# Altium footprint library ThanhNT.PcbLib: 579 footprints (part 11 of 37)
Each footprint in its own frame and in the unit in brackets; x right, y up, seen from the top. Pads: shape width x height; smd on the part's side, far side on the other; paste and mask are expansions set on the pad; w line width, h text height; cw(c..) or ccw(c..) is an arc to the next point about the centre after c.
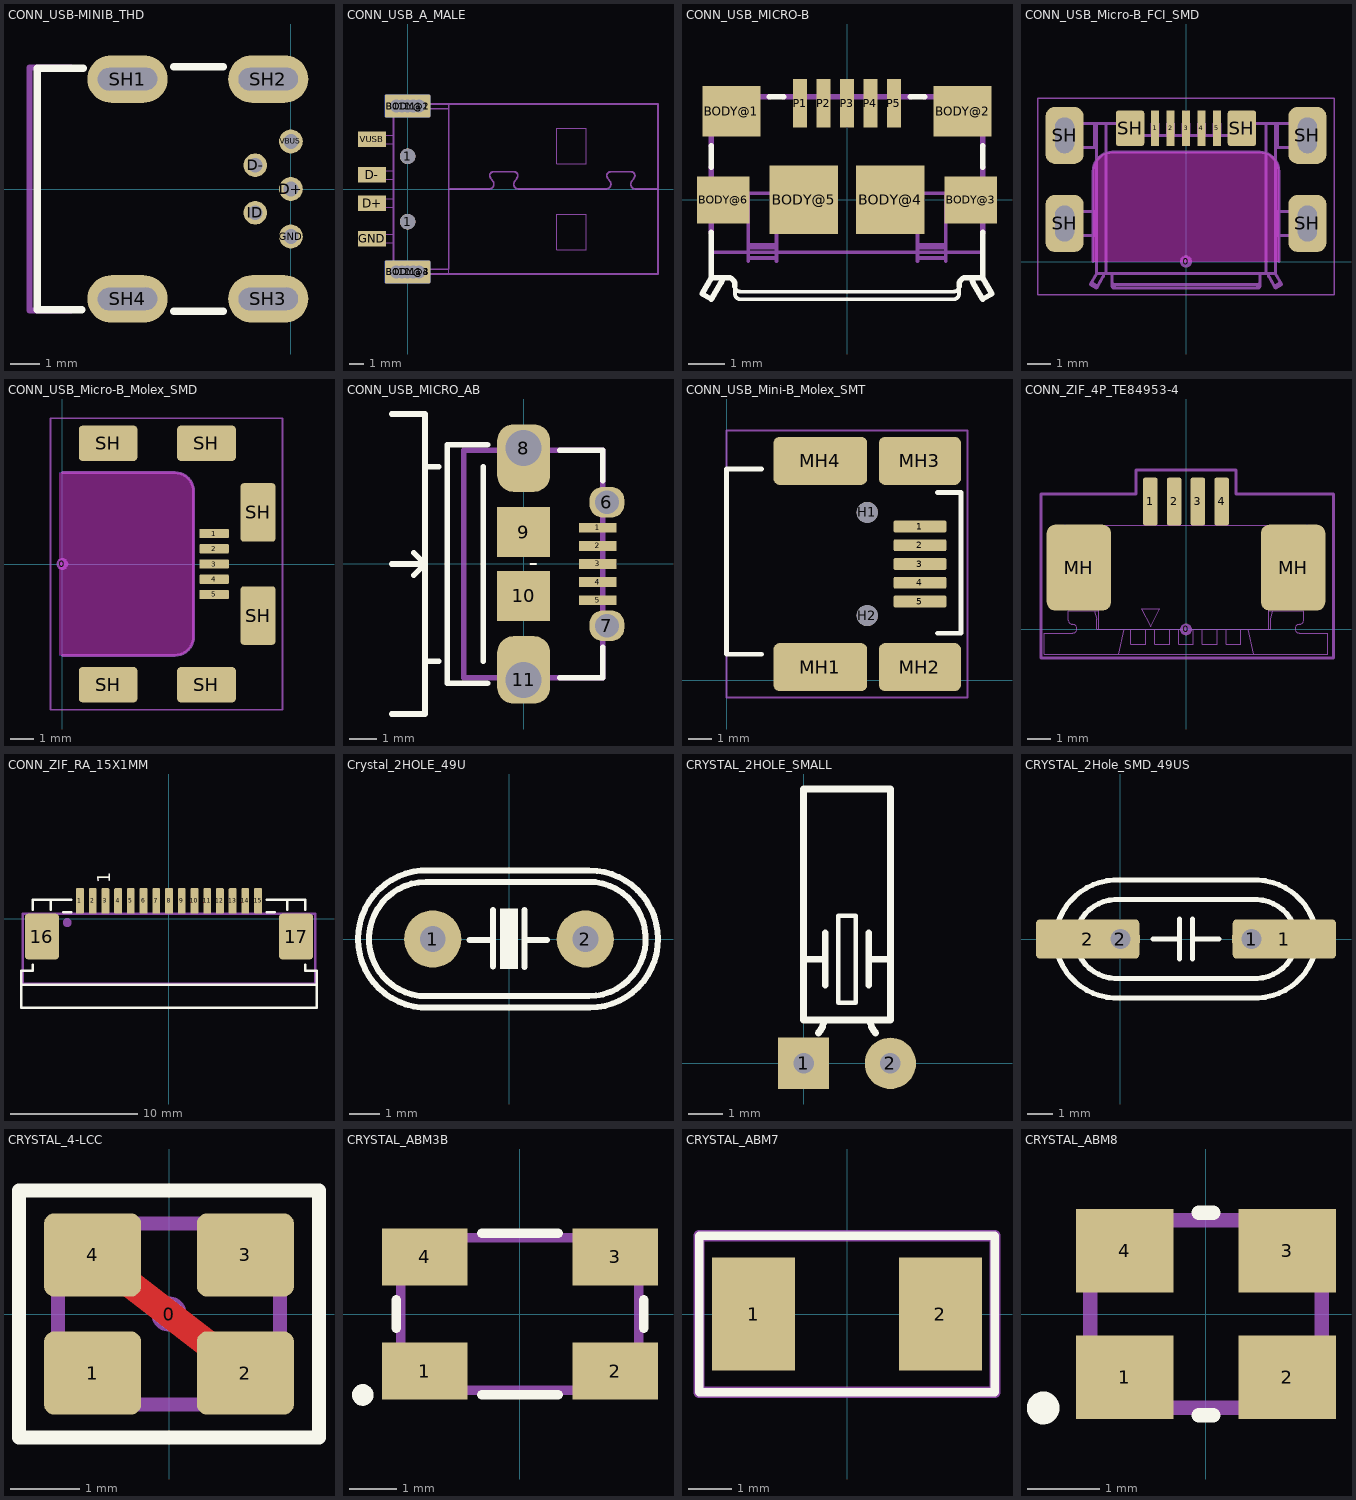
[diagram p10: the footprints below, top view; thin cyan lines are the x and y axes]

## CONN_USB-MINIB_THD [mm]
pads (9):
  round 0.8 hole 0.5: D+(0,0) D-(-1.2,0.8) GND(0,-1.6) ID(-1.2,-0.8) VBUS(0,1.6)
  oval 2.7x1.6 hole 0.762 slot 2 at 0.4 deg: SH1(-5.5,3.7) SH2(-0.762,3.7) SH3(-0.762,-3.7) SH4(-5.5,-3.7)
Top Overlay:
  lines w0.254: -7.036,-4.064 -8.534,-4.064 -8.534,4.064 -6.985,4.064 ; -3.937,-4.115 -2.286,-4.115 ; -3.937,4.115 -2.286,4.115
Mechanical 16:
  lines w0.203: -7.396,-4.089 -8.796,-4.089 -8.796,4.089 -7.396,4.089
3D body "43797.stp": height 3.91, standoff -2.59, extent -8.721,-4.075 0.104,4.075

## CONN_USB_A_MALE [mil]
pads (20):
  round 35.43 hole 35.43: 1(-31.5,-230.32) 1(-31.5,230.32) 1(-15.75,-230.32) 1(-15.75,230.32) 1(0,-230.32) 1(0,230.32) 1(15.75,-230.32) 1(15.75,230.32) 1(31.5,-230.32) 1(31.5,230.32)
  round 43.31 hole 43.31: 1(0,-90.55) 1(0,90.55)
  rrect10% 125.98x62.99 smd: BODY@1(0,230.32) BODY@3(0,-230.32)
  rrect10% 125.98x62.99 smd far side: BODY@2(0,230.32) BODY@4(0,-230.32)
  rect 78.35x43.31 smd: D+(-98.43,-39.37) D-(-98.43,39.37) GND(-98.43,-137.8) VUSB(-98.43,137.8)
Mechanical 1:
  lines w0: -31.5,-248.03 cw(c-31.5,-230.31) -31.5,-212.6 31.5,-212.6 cw(c31.5,-230.31) 31.5,-248.03 -31.5,-248.03 ; -31.5,212.6 cw(c-31.5,230.31) -31.5,248.03 31.5,248.03 cw(c31.5,230.31) 31.5,212.6 -31.5,212.6
Mechanical 11:
  lines w0: -31.5,212.6 cw(c-31.5,230.31) -31.5,248.03 31.5,248.03 cw(c31.5,230.31) 31.5,212.6 -31.5,212.6
Mechanical 16:
  lines w2: -76.77,-149.61 -76.77,-125.98 ; -76.77,-51.18 -76.77,-27.56 ; -76.77,27.56 -76.77,51.18 ; -39.37,-222.44 -39.37,-236.22 -39.37,-253.15 39.37,-253.15 39.37,-236.22 39.37,-222.44 ; -39.37,-149.61 -125.98,-149.61 -125.98,-125.98 -39.37,-125.98 ; -39.37,-51.18 -125.98,-51.18 -125.98,-27.56 -39.37,-27.56 ; -39.37,27.56 -125.98,27.56 -125.98,51.18 -39.37,51.18 ; -39.37,125.98 -76.77,125.98 ; -39.37,149.61 -76.77,149.61 ; -39.37,222.44 -39.37,236.22 -39.37,253.15 39.37,253.15 39.37,236.22 39.37,222.44 ; 114.17,-236.22 114.17,-222.44 ; 296.68,20.72 296.96,21.13 ; 621.48,20.72 621.76,21.13 ; -76.77,125.98 -76.77,149.61 ; -76.77,125.98 -125.98,125.98 -125.98,149.61 -76.77,149.61 ; 414.17,-168.11 414.17,-69.69 495.28,-69.69 495.28,-168.11 414.17,-168.11 ; 414.17,69.69 414.17,168.11 495.28,168.11 495.28,69.69 414.17,69.69
  lines w5: -39.37,-236.22 39.37,-236.22 114.17,-236.22 694.88,-236.22 694.88,0 ; -39.37,236.22 39.37,236.22 114.17,236.22 ; 236.9,21.13 cw(c225.8,13.37) 227.95,0 114.17,0 ; 237.18,20.72 229.83,31.5 cw(c238.19,37.4) 238.19,47.64 295.67,47.64 cw(c295.67,37.4) 304.03,31.5 296.96,21.13 ccw(c308.06,13.37) 305.91,0 552.76,0 ccw(c550.61,13.37) 561.7,21.13 ; 561.98,20.72 554.63,31.5 cw(c562.99,37.4) 562.99,47.64 620.47,47.64 cw(c620.47,37.4) 628.83,31.5 621.76,21.13 ccw(c632.86,13.37) 630.71,0 694.88,0 ; 114.17,0 114.17,-222.44 -39.37,-222.44 -39.37,-149.61 -39.37,-125.98 -39.37,-51.18 -39.37,-27.56 -39.37,27.56 -39.37,51.18 -39.37,125.98 -39.37,149.61 -39.37,222.44 39.37,222.44 114.17,222.44 ; 114.17,0 114.17,222.44 ; 114.17,222.44 114.17,236.22 ; 114.17,236.22 694.88,236.22 694.88,0
Mechanical 30:
  lines w0: -31.5,212.6 cw(c-31.5,230.31) -31.5,248.03 31.5,248.03 cw(c31.5,230.31) 31.5,212.6 -31.5,212.6

## CONN_USB_MICRO-B [mm]
pads (11):
  rect 1.6x1.4 smd: BODY@1(-3.2,2.45) BODY@2(3.2,2.45)
  rect 1.45x1.3 smd: BODY@3(3.425,0) BODY@6(-3.425,0)
  rect 1.9x1.9 smd: BODY@4(1.2,0) BODY@5(-1.2,0)
  rect 0.4x1.35 smd: P1(-1.3,2.675) P2(-0.65,2.675) P3(0,2.675) P4(0.65,2.675) P5(1.3,2.675)
Top Overlay:
  lines w0.102: -3.1,-2.6 ccw(c-2.95,-2.6) -2.95,-2.75 2.95,-2.75 ccw(c2.95,-2.6) 3.1,-2.6 3.1,-2.39 cw(c2.95,-2.39) 2.95,-2.54 -2.95,-2.54 cw(c-2.95,-2.39) -3.1,-2.39 -3.1,-2.6
  lines w0.152: -3.75,-0.9 -3.75,-2.15 ; -3.75,0.9 -3.75,1.5 ; -3.1,-2.39 -3.1,-2.35 ccw(c-3.3,-2.35) -3.3,-2.15 -3.45,-2.15 ; -2.15,2.85 -1.75,2.85 ; 1.75,2.85 2.15,2.85 ; 3.1,-2.39 3.1,-2.35 cw(c3.3,-2.35) 3.3,-2.15 3.45,-2.15 ; 3.75,-0.9 3.75,-2.15 ; 3.75,0.9 3.75,1.5 ; -3.75,-2.15 -3.45,-2.15 ; -3.75,-2.15 -4.01,-2.6 -3.75,-2.75 -3.484,-2.288 ccw(c-3.725,-2.157) -3.45,-2.15 ; 3.45,-2.15 ccw(c3.75,-2.15) 3.49,-2.3 3.75,-2.75 4.01,-2.6 3.75,-2.15 ; 3.45,-2.15 3.75,-2.15
Mechanical 14:
  lines w0.102: -3.75,-1.45 3.75,-1.45 ; -2.73,-1.69 -2.73,-1.61 ; -1.95,-1.69 -1.95,-1.61 ; 1.95,-1.69 1.95,-1.61 ; 2.73,-1.69 2.73,-1.61 ; -2.73,-1.61 -2.73,-1.32 ; -2.73,-1.61 -1.95,-1.61 ; -2.73,-1.32 -2.73,-1.24 ; -2.73,-1.32 -1.95,-1.32 ; -2.73,-1.24 -2.73,0.18 -1.95,0.18 -1.95,-1.24 ; -2.73,-1.24 -1.95,-1.24 ; -1.95,-1.61 -1.95,-1.32 ; -1.95,-1.32 -1.95,-1.24 ; 1.95,-1.61 1.95,-1.32 ; 1.95,-1.61 2.73,-1.61 ; 1.95,-1.32 1.95,-1.24 ; 1.95,-1.32 2.73,-1.32 ; 1.95,-1.24 1.95,0.18 2.73,0.18 2.73,-1.24 ; 1.95,-1.24 2.73,-1.24 ; 2.73,-1.61 2.73,-1.32 ; 2.73,-1.32 2.73,-1.24
  lines w0.152: -3.75,-0.9 -3.75,0.9 ; -3.75,1.5 -3.75,2.85 -2.15,2.85 ; -1.75,2.85 1.75,2.85 ; 2.15,2.85 3.75,2.85 3.75,1.5 ; 3.75,-0.9 3.75,0.9

## CONN_USB_Micro-B_FCI_SMD [mm]
height 2.286
pads (12):
  round 0.508 on Mech15: 0(0,0)
  rrect20% 0.35x1.5 smd: 1(-1.3,5.6) 2(-0.65,5.6) 3(0,5.6) 4(0.65,5.6) 5(1.3,5.6)
  rrect50% 1.6x2.4 hole 0.8 slot 1.5 at 90 deg: SH(-5.1,1.6) SH(-5.1,5.3) SH(5.1,1.6) SH(5.1,5.3)
  rrect20% 1.2x1.5 smd: SH(-2.35,5.6) SH(2.35,5.6)
Top Solder:
  region: 1.905,4.826 1.905,6.35 -1.905,6.35 -1.905,4.826
Keep-Out Layer:
  board cut-out: -3.9,0 -3.9,3.797 -3.9,3.875 -3.869,4.03 -3.809,4.175 -3.721,4.307 -3.61,4.418 -3.479,4.505 -3.333,4.566 -3.179,4.597 -3.1,4.597 3.1,4.597 3.179,4.597 3.333,4.566 3.479,4.505 3.61,4.418 3.721,4.307 3.809,4.175 3.869,4.03 3.9,3.875 3.9,3.797 3.9,0
Mechanical 13:
  lines w0.127: -4.85,1.1 -4.85,2.1 ; -4.85,4.8 -4.85,5.8 ; -3.97,-0.881 -3.71,-1.031 ; -3.85,1.1 -3.85,2.1 ; -3.85,4.8 -3.85,5.8 ; -3.75,1.1 -5.25,1.1 -5.25,2.1 -3.75,2.1 ; -3.75,4.8 -5.25,4.8 -5.25,5.8 -2.577,5.8 cw(c-2.577,5.6) -2.443,5.748 -2.007,5.352 ccw(c-1.873,5.5) -1.873,5.3 1.873,5.3 ccw(c1.873,5.5) 2.007,5.352 2.443,5.748 cw(c2.577,5.6) 2.577,5.8 5.25,5.8 5.25,4.8 3.75,4.8 ; -3.75,5.8 -3.75,-0.5 ; -3.45,-0.5 cw(c-3.75,-0.501) -3.49,-0.651 -3.76,-1.118 -4.02,-0.968 -3.75,-0.5 ; -3.35,-0.5 -3.35,5.8 ; -3.1,-0.881 ccw(c-3.006,-0.874) -3,-0.968 ; -2.526,5.793 -2.526,5.8 ; -2.229,5.553 ccw(c-2.275,5.8) -2.024,5.8 -1.825,5.8 -1.825,5.3 ; -1.425,5.3 -1.425,5.8 -1.175,5.8 -1.175,5.3 ; -0.775,5.3 -0.775,5.8 -0.525,5.8 -0.525,5.3 ; -0.125,5.3 -0.125,5.8 0.125,5.8 0.125,5.3 ; 0.525,5.3 0.525,5.8 0.775,5.8 0.775,5.3 ; 1.175,5.3 1.175,5.8 1.425,5.8 1.425,5.3 ; 1.825,5.3 1.825,5.8 2.024,5.8 ccw(c2.275,5.8) 2.229,5.553 ; 2.526,5.793 2.526,5.8 ; 3.1,-0.881 cw(c3.006,-0.874) 3,-0.968 ; 3.35,-0.5 3.35,5.8 ; 3.45,-0.5 ccw(c3.75,-0.501) 3.49,-0.651 3.76,-1.118 4.02,-0.968 3.75,-0.5 ; 3.71,-1.031 3.97,-0.881 ; 3.75,1.1 5.25,1.1 5.25,2.1 3.75,2.1 ; 3.75,5.8 3.75,-0.5 ; 3.85,1.1 3.85,2.1 ; 3.85,4.8 3.85,5.8 ; 4.85,1.1 4.85,2.1 ; 4.85,4.8 4.85,5.8 ; -3.75,-0.5 -3.1,-0.5 ; -3.1,-0.5 3.1,-0.501 ; -3.1,-0.5 -3.1,-1.031 ccw(c-3.006,-1.024) -3,-1.118 ; -3,-1.118 3,-1.118 ; -3,-1.118 -3,-0.968 ; -3,-0.968 3,-0.968 ; 3,-1.118 ccw(c3.006,-1.024) 3.1,-1.031 3.1,-0.5 ; 3,-1.118 3,-0.968 ; 3.1,-0.5 3.75,-0.5
Mechanical 15:
  lines w0.076: -6.223,-1.397 -6.223,6.858 6.223,6.858 6.223,-1.397 -6.223,-1.397
  lines w0.127: -3.9,0 -3.9,3.797 cw(c-3.1,3.797) -3.1,4.597 3.1,4.597 cw(c3.1,3.797) 3.9,3.797 3.9,0
3D body "Micro USB B-type mid-mount FCI.STEP": height 2.15, standoff -0.92, extent -5.25,-1.118 5.25,5.8
3D body "USB Micro B plug.STEP": height 4.67, standoff -3.53, extent -5.35,-21.579 5.35,2.921

## CONN_USB_Micro-B_Molex_SMD [mm]
height 1.2
pads (12):
  round 0.508 on Mech15: 0(0,0)
  rrect20% 1.25x0.4 smd: 1(6.475,1.3) 2(6.475,0.65) 3(6.475,0) 4(6.475,-0.65) 5(6.475,-1.3)
  rrect20% 2.5x1.5 smd: SH(1.95,-5.15) SH(1.95,5.15) SH(6.15,-5.15) SH(6.15,5.15)
  rrect20% 1.5x2.5 smd: SH(8.35,-2.2) SH(8.35,2.2)
Top Solder:
  rectangle: 5.842,-1.27 7.112,1.27
Keep-Out Layer:
  board cut-out: -0.127,3.9 4.8,3.9 4.879,3.9 5.033,3.869 5.179,3.809 5.31,3.721 5.421,3.61 5.509,3.479 5.569,3.333 5.6,3.179 5.6,3.1 5.6,-3.1 5.6,-3.179 5.569,-3.333 5.509,-3.479 5.421,-3.61 5.31,-3.721 5.179,-3.809 5.033,-3.869 4.879,-3.9 4.8,-3.9 -0.127,-3.9
Mechanical 13:
  lines w0.127: 0,-3.9 4.8,-3.9 ccw(c4.8,-3.1) 5.6,-3.1 5.6,3.1 ccw(c4.8,3.1) 4.8,3.9 0,3.9
Mechanical 15:
  lines w0.076: -0.5,-6.223 -0.5,6.223 9.398,6.223 9.398,-6.223 -0.5,-6.223
3D body "USB Micro B plug.STEP": height 4.1, standoff -4.1, extent -21.007,-5.35 3.492,5.35
3D body "Micro USB B Receptacle Middle Mount.STEP": height 1.43, standoff -1.52, extent -0.43,-5.5 8.7,5.5

## CONN_USB_MICRO_AB [mm]
pads (11):
  rect 1.35x0.35 smd mask+0.025: 1(2.675,1.3) 2(2.675,0.65) 3(2.675,0) 4(2.675,-0.65) 5(2.675,-1.3)
  rrect84% 1.25x1.1 hole 0.85 mask+0.04: 6(3,2.225) 7(3,-2.225)
  rrect60% 1.9x2.425 hole 1.3 copper offset 0,-0.363: 8(0,4.175)
  rect 1.9x1.8 smd paste-10: 9(0,1.15) 10(0,-1.15)
  rrect60% 1.9x2.425 hole 1.3 copper offset 0,0.363: 11(0,-4.175)
Top Overlay:
  lines w0.08: 0.25,0 0.45,0
  lines w0.2: -4.75,-5.4 -3.55,-5.4 -3.55,5.4 -4.75,5.4 ; -4.75,0 -3.55,0 ; -3.95,-0.4 -3.55,0 ; -3.95,0.4 -3.55,0 ; -3.55,-3.5 -3.05,-3.5 ; -3.55,3.5 -3.05,3.5 ; -1.45,-3.5 -1.45,3.5 ; -1.3,-4.3 -2.75,-4.3 -2.75,4.3 -1.3,4.3 ; 1.3,-4.1 2.85,-4.1 2.85,-3 ; 1.3,4.1 2.85,4.1 2.85,3
Mechanical 16:
  lines w0.2: -2.15,-4.1 2.85,-4.1 2.85,4.1 -2.15,4.1 -2.15,-4.1
3D body "475890001.stp": height 2.76, standoff -0.58, extent -2.75,-4.325 3.045,4.325

## CONN_USB_Mini-B_Molex_SMT [mm]
height 3.95
pads (11):
  rrect25% 2.25x0.5 smd: 1(8.25,6.55) 2(8.25,5.75) 3(8.25,4.95) 4(8.25,4.15) 5(8.25,3.35)
  round 0.9 hole 0.9 unplated: H1(6,7.15) H2(6,2.75)
  rrect25% 4x2.05 smd: MH1(4,0.55) MH4(4,9.35)
  rrect25% 3.5x2.05 smd: MH2(8.25,0.55) MH3(8.25,9.35)
Top Overlay:
  lines w0.2: 1.5,1.1 0,1.1 0,9 1.5,9 ; 9,2 10,2 10,8 9,8
Mechanical 15:
  lines w0.076: 0,-0.75 10.275,-0.75 10.275,10.65 0,10.65 0,-0.75
3D body: height 3.95, standoff 0, extent 0,1.1 9,9

## CONN_ZIF_4P_TE84953-4 [mm] "TE Connectivity 4-pin ZIF connector"
height 2.74
pads (7):
  round 0.5 on Mech15: 0(0,0)
  rrect25% 0.61x2 smd: 1(-1.5,5.375) 2(-0.5,5.375) 3(0.5,5.375) 4(1.5,5.375)
  rrect25% 2.7x3.6 smd: MH(-4.5,2.6) MH(4.5,2.6)
Mechanical 13:
  lines w0.05: -4.56,3.1 -3.93,3.1 ; -4.56,4.37 -4.56,0.87 -3.67,0.87 -3.67,0 ; -4.28,4.37 -4.18,3.997 -4.18,3.1 ; -4.18,0.86 -4.18,0.87 ; -3.982,0.87 -3.982,0.86 -5.072,0.86 cw(c-5.072,0.96) -5.172,0.96 -5.172,1.261 cw(c-5.072,1.261) -5.072,1.361 -4.762,1.361 ccw(c-4.762,1.461) -4.662,1.461 -4.662,1.763 ccw(c-4.762,1.763) -4.762,1.863 -5.072,1.863 cw(c-5.072,1.963) -5.172,1.963 -5.172,2.264 cw(c-5.072,2.264) -5.072,2.364 -4.762,2.364 ccw(c-4.762,2.464) -4.662,2.464 -4.662,2.766 ccw(c-4.762,2.766) -4.762,2.866 -5.072,2.866 cw(c-5.072,2.966) -5.172,2.966 -5.172,3.267 cw(c-5.072,3.267) -5.072,3.367 -4.762,3.367 ccw(c-4.762,3.467) -4.662,3.467 -4.662,3.769 ccw(c-4.762,3.769) -4.762,3.869 -5.072,3.869 cw(c-5.072,3.969) -5.172,3.969 -5.172,4.27 cw(c-5.072,4.27) -5.072,4.37 5.072,4.37 cw(c5.072,4.27) 5.172,4.27 5.172,3.969 cw(c5.072,3.969) 5.072,3.869 4.762,3.869 ccw(c4.762,3.769) 4.662,3.769 4.662,3.467 ccw(c4.762,3.467) 4.762,3.367 5.072,3.367 cw(c5.072,3.267) 5.172,3.267 5.172,2.966 cw(c5.072,2.966) 5.072,2.866 4.762,2.866 ccw(c4.762,2.766) 4.662,2.766 4.662,2.464 ccw(c4.762,2.464) 4.762,2.364 5.072,2.364 cw(c5.072,2.264) 5.172,2.264 5.172,1.963 cw(c5.072,1.963) 5.072,1.863 4.762,1.863 ccw(c4.762,1.763) 4.662,1.763 4.662,1.461 ccw(c4.762,1.461) 4.762,1.361 5.072,1.361 cw(c5.072,1.261) 5.172,1.261 5.172,0.96 cw(c5.072,0.96) 5.072,0.86 4.232,0.86 4.229,0.87 ; -3.93,0.87 -3.93,3.997 -3.83,4.37 ; -3.846,0.79 -3.75,0.43 -3.75,0 3.55,0 3.55,0.43 3.646,0.79 ; -3.67,0.79 -4.94,0.79 -4.94,0.39 ccw(c-4.76,0.39) -4.76,0.21 cw(c-4.76,0.03) -4.76,-0.15 -5.96,-0.15 -5.96,-1.04 5.96,-1.04 5.96,-0.15 4.76,-0.15 cw(c4.76,0.03) 4.76,0.21 ccw(c4.76,0.39) 4.94,0.39 4.94,0.79 3.47,0.79 ; -2.82,-1.04 -2.59,0 ; -2.311,0 -2.311,-0.63 -1.691,-0.63 -1.691,0 ; -1.596,4.37 -1.596,5.51 -1.396,5.51 -1.396,4.37 ; -1.596,4.88 -1.396,4.88 ; -1.596,5.01 -1.396,5.01 ; -1.596,5.38 -1.396,5.38 ; -1.311,0 -1.311,-0.63 -0.691,-0.63 -0.691,0 ; -0.596,4.37 -0.596,5.51 -0.396,5.51 -0.396,4.37 ; -0.596,4.88 -0.396,4.88 ; -0.596,5.01 -0.396,5.01 ; -0.596,5.38 -0.396,5.38 ; -0.31,0 -0.31,-0.63 0.309,-0.63 0.309,0 ; 0.405,4.37 0.405,5.51 0.604,5.51 0.604,4.37 ; 0.405,4.88 0.604,4.88 ; 0.405,5.01 0.604,5.01 ; 0.405,5.38 0.604,5.38 ; 0.69,0 0.69,-0.63 1.309,-0.63 1.309,0 ; 1.405,4.37 1.405,5.51 1.605,5.51 1.605,4.37 ; 1.405,4.88 1.605,4.88 ; 1.405,5.01 1.605,5.01 ; 1.405,5.38 1.605,5.38 ; 1.69,0 1.69,-0.63 2.31,-0.63 2.31,0 ; 2.59,0 2.82,-1.04 ; 3.47,0 3.47,0.87 4.56,0.87 4.56,4.37 ; 3.83,0.87 3.93,1.243 3.93,4.37 ; 3.93,2.14 4.18,2.14 4.18,1.243 4.28,0.87 ; 4.18,1.92 4.56,1.92 ; -1.871,0.87 -1.111,0.87 -1.49,0.11 -1.871,0.87
Mechanical 15:
  lines w0.127: -6.1,-1.2 -6.1,5.7 -2.1,5.7 -2.1,6.7 2.1,6.7 2.1,5.7 6.2,5.7 6.2,-1.2 -6.1,-1.2
3D body "ZIF Conn TE 84953-4.STEP": height 2.58, standoff 0, extent -5.96,-1.04 5.96,5.51

## CONN_ZIF_RA_15X1MM [mm]
pads (17):
  rrect20% 0.61x2 smd: 1(-7,1.4) 2(-6,1.4) 3(-5,1.4) 4(-4,1.4) 5(-3,1.4) 6(-2,1.4) 7(-1,1.4) 8(0,1.4) 9(1,1.4) 10(2,1.4) 11(3,1.4) 12(4,1.4) 13(5,1.4) 14(6,1.4) 15(7,1.4)
  rrect20% 2.68x3.6 smd: 16(-9.99,-1.4) 17(9.99,-1.4)
Top Overlay:
  lines w0.2: -11.6,-5.2 11.6,-5.2 ; -10.7,-3.6 -10.7,-4.1 -11.6,-4.1 -11.6,-7 11.6,-7 11.6,-4.1 10.7,-4.1 10.7,-3.6 ; -10.7,0.7 -10.7,1.5 -7.7,1.5 ; -9.3,0.7 -9.3,1.5 ; -8.3,0.5 -7.7,0.5 ; 7.7,0.5 8.3,0.5 ; 7.7,1.5 10.7,1.5 10.7,0.7 ; 9.3,0.7 9.3,1.5
  text "1" at -4.6,2.8 h1.02
Mechanical 16:
  circle w0.5: c-8,-0.3 r0.1
  lines w0.2: -11.5,-5.1 -11.5,0.4 11.5,0.4 11.5,-5.1 -11.5,-5.1
3D body "c-1-84952-5-a-3d.stp": height 2.53, standoff -0.03, extent -11.46,-5.038 11.46,1.502

## Crystal_2HOLE_49U [mil] "Footpin for Crystal 2 pin"
pads (2):
  round 75 hole 34: 1(-100,0) 2(100,0)
Top Overlay:
  region: 11.5,40 11.5,-39 -11.5,-39 -11.5,40
  lines w7.87: -109,75 ccw(c-108.5,0) -108.27,-75 ; -106.97,-75 103.03,-75 ; -105.97,75 104.03,75 ; -105.02,-90 105.91,-90 ccw(c105.31,0) 105.03,90 -104.97,90.01 ccw(c-108,0.06) -105.02,-89.89 ; -52,-1 -21,-1 ; -21,-36 -21,38 ; 20,-37 20,38 ; 20,-1 50,-1 ; 104,75 cw(c104.23,0) 104.73,-75
3D body "SW3dPS-HP49US.STEP": height 137.8, standoff -157.48, extent -233.43,-93.07 213.43,90

## CRYSTAL_2HOLE_SMALL [mm] "Connector; Header; 2 Position"
height 5.59
pads (2):
  rect 1.5x1.5 hole 0.6: 1(0,0)
  round 1.5 hole 0.6: 2(2.54,0)
Top Overlay:
  lines w0.127: 1.016,1.778 1.524,1.778 1.524,4.318 1.016,4.318 1.016,1.778
  lines w0.2: 0.127,3.048 0.635,3.048 ; 0.432,0.889 ccw(c0.064,1.257) 0.584,1.257 0.584,1.27 ; 0.635,2.286 0.635,3.81 ; 1.905,2.286 1.905,3.81 ; 1.905,3.048 2.413,3.048 ; 1.956,1.27 1.956,1.257 ccw(c2.476,1.257) 2.108,0.889 ; 0,1.27 2.54,1.27 2.54,8.026 0,8.026 0,1.27
3D body "User Library-XTAL.STEP": height 2.05, standoff -1.87, extent -0.115,-0.203 2.667,8.178

## CRYSTAL_2Hole_SMD_49US [mil]
pads (4):
  round 60 hole 30: 1(200,0) 2(0,0)
  rrect20% 157.48x60 smd: 1(250,0) 2(-50,0)
Top Overlay:
  lines w7.87: 50,0 60,0 90,0 ; 90,-30 90,30 ; 110,-30 110,30 ; 110,0 150,0 120,0 ; -100,0 cw(c-5,-5) 0,90 200,90 cw(c205,-5) 300,0 cw(c205,5) 200,-90 0,-90 cw(c-5,5) -100,0 ; -70,0 cw(c-5,-5) 0,60 200,60 cw(c205,-5) 270,0 cw(c205,5) 200,-60 0,-60 cw(c-5,5) -70,0

## CRYSTAL_4-LCC [mm] "SMD Crystal 4-lead leadless package"
height 0.8
pads (5):
  round 0.508 on Mech15: 0(0,0)
  rrect25% 1.4x1.2 smd: 1(-1.1,-0.85) 2(1.1,-0.85) 3(1.1,0.85) 4(-1.1,0.85)
Top Layer:
  lines w0.4: -1.1,0.85 1.1,-0.85
Top Overlay:
  lines w0.2: -2.159,-1.778 -2.159,1.778 2.159,1.778 2.159,-1.778 -2.159,-1.778
Mechanical 13:
  lines w0.05: -1.65,-1.143 -1.493,-1.3 1.493,-1.3 1.65,-1.143 1.65,1.144 1.494,1.3 -1.493,1.3 -1.65,1.143 -1.65,-1.143
Mechanical 15:
  lines w0.127: -2.159,-1.778 2.159,-1.778 2.159,1.778 -2.159,1.778 -2.159,-1.778
Mechanical 16:
  circle w0.254: c-1.2,-0.9 r0.1
  lines w0.2: -1.6,-1.3 -1.6,1.3 1.6,1.3 1.6,-1.3 -1.6,-1.3
3D body "Crystal TXC Corp 7M series.STEP": height 0.8, standoff 0, extent -1.65,-1.3 1.65,1.3

## CRYSTAL_ABM3B [mm]
pads (4):
  rect 1.8x1.2 smd: 1(-2,-1.2) 2(2,-1.2) 3(2,1.2) 4(-2,1.2)
Top Overlay:
  circle w0.254: c-3.3,-1.7 r0.1
  lines w0.2: -2.6,-0.3 -2.6,0.3 ; -0.8,-1.7 0.8,-1.7 ; -0.8,1.7 0.8,1.7 ; 2.6,-0.3 2.6,0.3
Mechanical 16:
  circle w0.254: c-2,-1.1 r0.1
  lines w0.2: -2.5,-1.6 -2.5,1.6 2.5,1.6 2.5,-1.6 -2.5,-1.6
3D body: height 1.12, standoff 1, extent -2,-1.2 2,1.2
3D body "ABM3B.STEP": height 1.12, standoff 0.02, extent -2.5,-1.6 2.5,1.6

## CRYSTAL_ABM7 [mm]
pads (2):
  rect 1.9x2.6 smd: 1(-2.15,0) 2(2.15,0)
Top Overlay:
  lines w0.2: -3.4,-1.8 -3.4,1.8 3.4,1.8 3.4,-1.8 -3.4,-1.8
Mechanical 16:
  lines w0.254: -3.4,-1.8 -3.4,1.8 3.4,1.8 3.4,-1.8 -3.4,-1.8
3D body "Xtal-ABM7.STEP": height 1.44, standoff 0.04, extent -3.1,-1.85 3.1,1.85
3D body: height 1.45, standoff 1.4, extent -2,-1.3 2,1.5

## CRYSTAL_ABM8 [mm]
pads (4):
  rect 1.35x1.15 smd mask+0.1: 1(-1.125,-0.875) 2(1.125,-0.875) 3(1.125,0.875) 4(-1.125,0.875)
Top Overlay:
  circle w0.254: c-2.25,-1.3 r0.1
  lines w0.2: -0.1,-1.4 0.1,-1.4 ; -0.1,1.4 0.1,1.4
Mechanical 16:
  circle w0.254: c-1.1,-0.9 r0.1
  lines w0.2: -1.6,-1.3 -1.6,1.3 1.6,1.3 1.6,-1.3 -1.6,-1.3
3D body "ABM8.step": height 0.75, standoff -0.01, extent -1.6,-1.25 1.6,1.25
3D body: height 0.76, standoff 0.6, extent -1.3,-1 1.3,1